# Altium schematic symbol library CUSTOM SCH - Copy.SchLib: 494 symbols (part 1 of 6) (continued)
## ADC3441
designator U?
footprint LFCSP-48(7x7) ADP5052
footprint QFN-56-EP(8x8) ADC3441
footprint ADC3441IRTQT
part A pins: 1 DA1P (out) "Positive serial LVDS output for wire-1 of channel A", 2 DA1M (out) "Negative serial LVDS output for wire-1 of channel A", 3 DA0P (out) "Positive serial LVDS output for wire-0 of channel A", 4 DA0M (out) "Negative serial LVDS output for wire-0 of channel A", 8 INAM (in) "Negative differential analog input for channel A", 9 INAP (in) "Positive differential analog input for channel A", 12 INBP (in) "Positive differential analog input for channel B", 13 INBM (in) "Negative differential analog input for channel B", 16 SCLK (in) "This pin has an internal 150-kΩ pullup resistor to AVDD", 17 SDATA (in) "Serial interface data input. This pin has an internal 150-kΩ pulldown resistor.", 18 ~{SEN} (in) "Serial interface enable; active low.", 19 SDOUT (out) "Serial interface data output", 21 CLKM (in) "Negative differential clock input for the ADC", 22 CLKP (in) "Positive differential clock input for the ADC", 24 RESET (in) "Hardware reset; active high. This pin has an internal 150-kΩ pulldown resistor.", 25 SYSREFP (in) "Positive external SYSREF input", 26 SYSREFM (in) "Negative external SYSREF input", 27 VCM (out) "Common-mode voltage for analog inputs", 30 INCM (in) "Negative differential analog input for channel C", 31 INCP (in) "Positive differential analog input for channel C", 34 INDP (in) "Positive differential analog input for channel D", 35 INDM (in) "Negative differential analog input for channel D", 39 DD1P (out) "Positive serial LVDS output for wire-1 of channel D", 40 DD1M (out) "Negative serial LVDS output for wire-1 of channel D", 41 DD0P (out) "Positive serial LVDS output for wire-0 of channel D", 42 DD0M (out) "Negative serial LVDS output for wire-0 of channel D", 43 DC1P (out) "Positive serial LVDS output for wire-1 of channel C", 44 DC1M (out) "Negative serial LVDS output for wire-1 of channel C", 45 DC0P (out) "Positive serial LVDS output for wire-0 of channel C", 46 DC0M (out) "Negative serial LVDS output for wire-0 of channel C", 48 FCLKP (out) "Positive frame clock output", 49 FCLKM (out) "Negative frame clock output", 50 DCLKP (out) "Positive bit clock output", 51 DCLKM (out) "Negative bit clock output", 53 DB1P (out) "Positive serial LVDS output for wire-1 of channel B", 54 DB1M (out) "Negative serial LVDS output for wire-1 of channel B", 55 DB0P (out) "Positive serial LVDS output for wire-0 of channel B", 56 DB0M (out) "Negative serial LVDS output for wire-0 of channel B", 57 GND (power) "Ground, 0 V. Connect to the printed circuit board (PCB) ground plane."
part B pins: 5 DVDD (power) "Digital 1.8-V power supply, decoupled with capacitors", 6 AVDD (power) "Analog 1.8-V power supply, decoupled with capacitors", 7 AVDD (power) "Analog 1.8-V power supply, decoupled with capacitors", 10 AVDD (power) "Analog 1.8-V power supply, decoupled with capacitors", 11 AVDD (power) "Analog 1.8-V power supply, decoupled with capacitors", 14 AVDD (power) "Analog 1.8-V power supply, decoupled with capacitors", 15 AVDD (power) "Analog 1.8-V power supply, decoupled with capacitors", 20 AVDD (power) "Analog 1.8-V power supply, decoupled with capacitors", 23 AVDD (power) "Analog 1.8-V power supply, decoupled with capacitors", 28 AVDD (power) "Analog 1.8-V power supply, decoupled with capacitors", 29 AVDD (power) "Analog 1.8-V power supply, decoupled with capacitors", 32 AVDD (power) "Analog 1.8-V power supply, decoupled with capacitors", 33 AVDD (power) "Analog 1.8-V power supply, decoupled with capacitors", 36 AVDD (power) "Analog 1.8-V power supply, decoupled with capacitors", 38 DVDD (power) "Digital 1.8-V power supply, decoupled with capacitors", 47 DVDD (power) "Digital 1.8-V power supply, decoupled with capacitors", 52 DVDD (power) "Digital 1.8-V power supply, decoupled with capacitors"

## ADP123AUJZ
designator U?
Manufacturer Part Number: ADP123AUJZ; Case/Package: *
pins: 1 VIN, 2 GND, 3 EN, 4 ADJ, 5 VOUT

## ADP2370ACPZ-5.0-R7
designator U?
Manufacturer Part Number: *; Case/Package: *
pins: 1 VIN, 2 FSEL, 3 EN, 4 SYNC, 5 FB, 6 PG, 7 SW, 8 PGND, 9 AGND

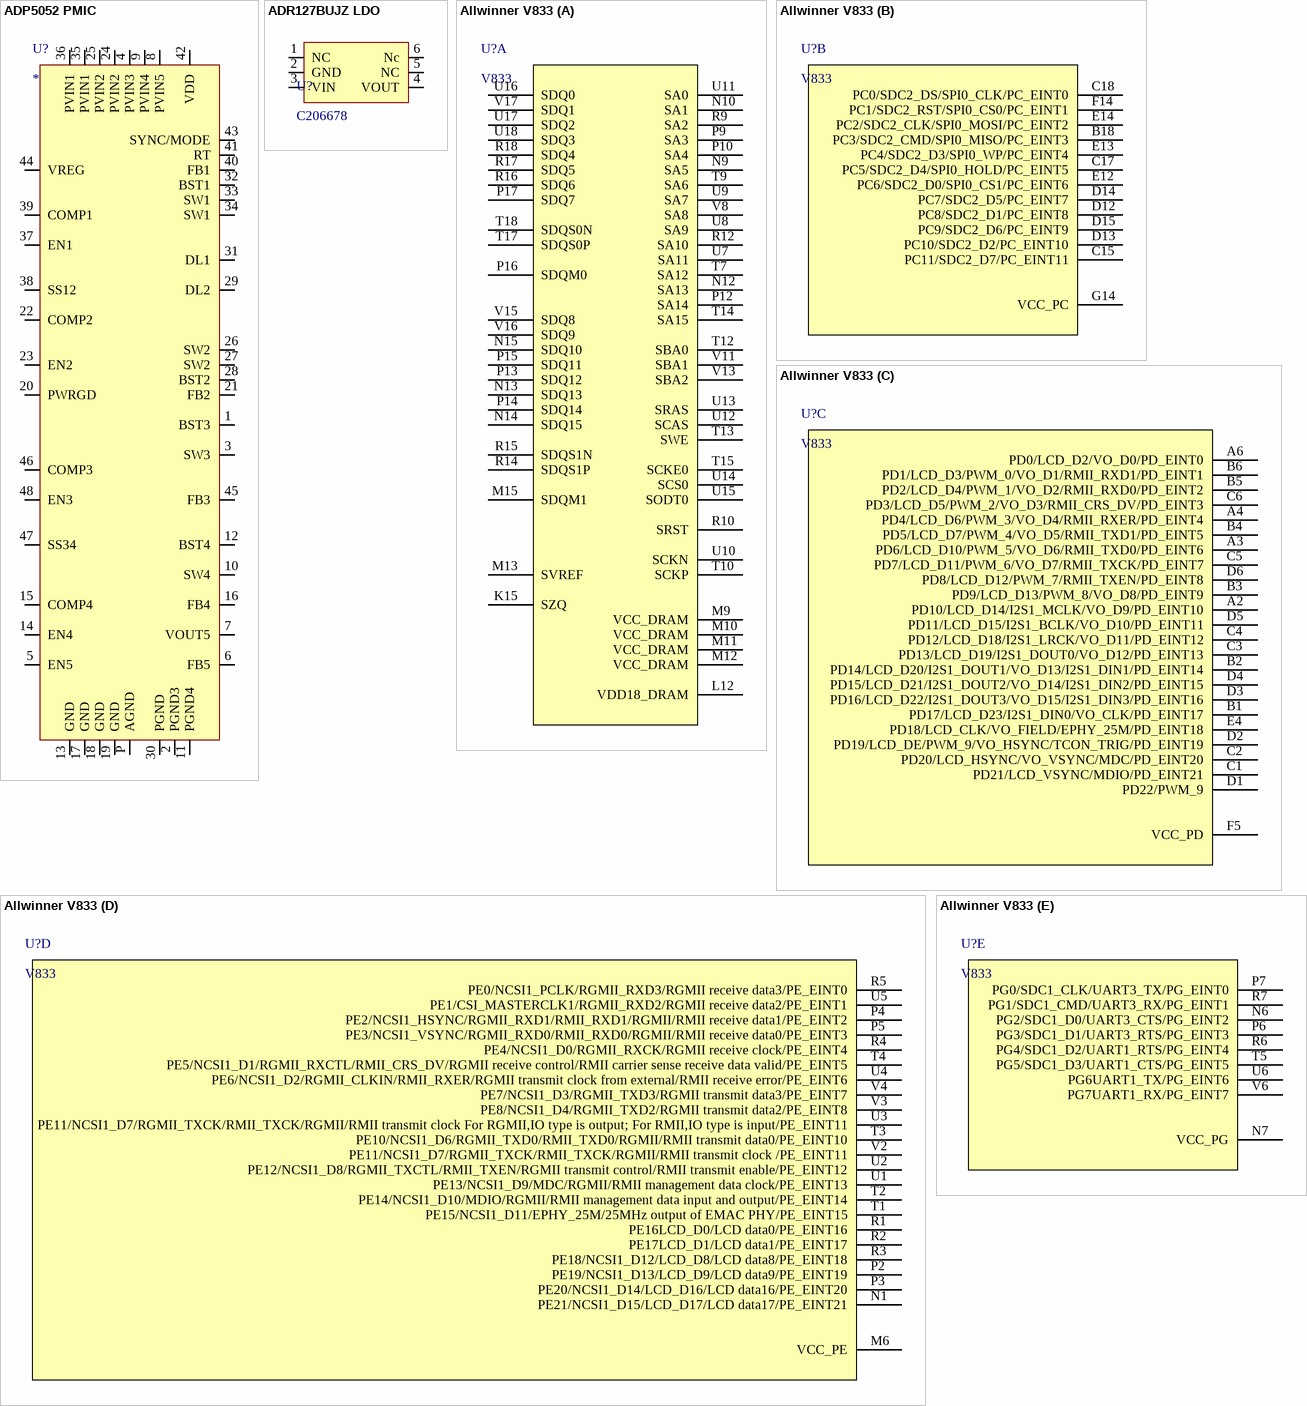
[diagram p3: symbols ADP5052 PMIC to Allwinner V833]

## ADP5052 PMIC
designator U?
Manufacturer Part Number: ADP5052; Case/Package: *
footprint LFCSP-48(7x7) ADP5052
pins: 1 BST3, 2 PGND3, 3 SW3, 4 PVIN3, 5 EN5, 6 FB5, 7 VOUT5, 8 PVIN5, 9 PVIN4, 10 SW4, 11 PGND4, 12 BST4, 13 GND, 14 EN4, 15 COMP4, 16 FB4, 17 GND, 18 GND, 19 GND, 20 PWRGD, 21 FB2, 22 COMP2, 23 EN2, 24 PVIN2, 25 PVIN2, 26 SW2, 27 SW2, 28 BST2, 29 DL2, 30 PGND, 31 DL1, 32 BST1, 33 SW1, 34 SW1, 35 PVIN1, 36 PVIN1, 37 EN1, 38 SS12, 39 COMP1, 40 FB1, 41 RT, 42 VDD, 43 SYNC/MODE, 44 VREG, 45 FB3, 46 COMP3, 47 SS34, 48 EN3, P AGND

## ADR127BUJZ LDO
designator U?, comment C206678
95uA 1.25V -40℃~+125℃@(Ta) ±0.12% 2.7V~18V series connection 9uVp-p 5mA 9ppm/℃ Fixed TSOT-23-6 Voltage References ROHS; Manufacturer Part NumberManufacturer Part Number: ADR127BUJZ; Case/Package: *
footprint TSOT-23-6
pins: 1 NC, 2 GND, 3 VIN, 4 VOUT, 5 NC, 6 Nc

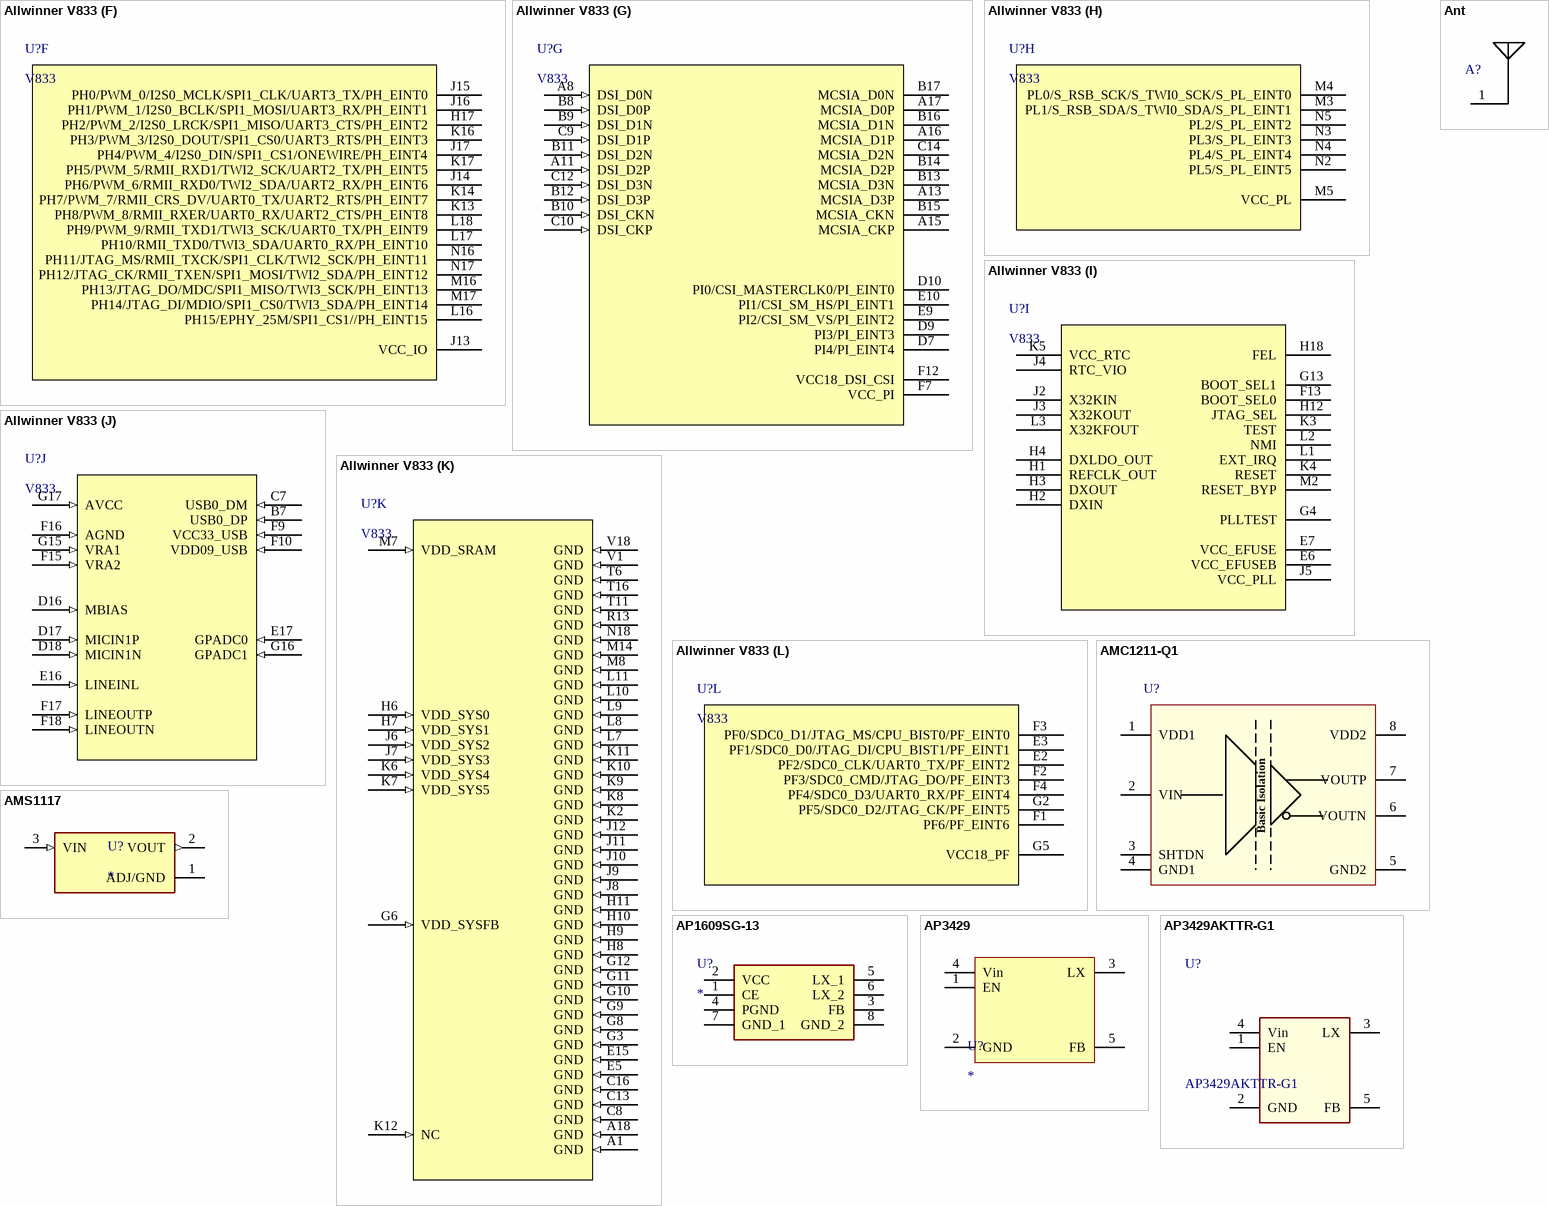
[diagram p4: symbols Allwinner V833 to AP3429AKTTR-G1]

## Allwinner V833
designator U?, comment V833
Manufacturer Part Number: Allwinner V833; Case/Package: LFBGA273
footprint LFBGA273 (Allwinner V833)
part A pins: K15 SZQ, L12 VDD18_DRAM, M9 VCC_DRAM, M10 VCC_DRAM, M11 VCC_DRAM, M12 VCC_DRAM, M13 SVREF, M15 SDQM1, N9 SA5, N10 SA1, N12 SA13, N13 SDQ13, N14 SDQ15, N15 SDQ10, P9 SA3, P10 SA4, P12 SA14, P13 SDQ12, P14 SDQ14, P15 SDQ11, P16 SDQM0, P17 SDQ7, R9 SA2, R10 SRST, R12 SA10, R14 SDQS1P, R15 SDQS1N, R16 SDQ6, R17 SDQ5, R18 SDQ4, T7 SA12, T9 SA6, T10 SCKP, T12 SBA0, T13 SWE, T14 SA15, T15 SCKE0, T17 SDQS0P, T18 SDQS0N, U7 SA11, U8 SA9, U9 SA7, U10 SCKN, U11 SA0, U12 SCAS, U13 SRAS, U14 SCS0, U15 SODT0, U16 SDQ0, U17 SDQ2, U18 SDQ3, V8 SA8, V11 SBA1, V13 SBA2, V15 SDQ8, V16 SDQ9, V17 SDQ1
part B pins: B18 PC3/SDC2_CMD/SPI0_MISO/PC_EINT3, C15 PC11/SDC2_D7/PC_EINT11, C17 PC5/SDC2_D4/SPI0_HOLD/PC_EINT5, C18 PC0/SDC2_DS/SPI0_CLK/PC_EINT0, D12 PC8/SDC2_D1/PC_EINT8, D13 PC10/SDC2_D2/PC_EINT10, D14 PC7/SDC2_D5/PC_EINT7, D15 PC9/SDC2_D6/PC_EINT9, E12 PC6/SDC2_D0/SPI0_CS1/PC_EINT6, E13 PC4/SDC2_D3/SPI0_WP/PC_EINT4, E14 PC2/SDC2_CLK/SPI0_MOSI/PC_EINT2, F14 PC1/SDC2_RST/SPI0_CS0/PC_EINT1, G14 VCC_PC
part C pins: A2 PD10/LCD_D14/I2S1_MCLK/VO_D9/PD_EINT10, A3 PD6/LCD_D10/PWM_5/VO_D6/RMII_TXD0/PD_EINT6, A4 PD4/LCD_D6/PWM_3/VO_D4/RMII_RXER/PD_EINT4, A6 PD0/LCD_D2/VO_D0/PD_EINT0, B1 PD17/LCD_D23/I2S1_DIN0/VO_CLK/PD_EINT17, B2 PD14/LCD_D20/I2S1_DOUT1/VO_D13/I2S1_DIN1/PD_EINT14, B3 PD9/LCD_D13/PWM_8/VO_D8/PD_EINT9, B4 PD5/LCD_D7/PWM_4/VO_D5/RMII_TXD1/PD_EINT5, B5 PD2/LCD_D4/PWM_1/VO_D2/RMII_RXD0/PD_EINT2, B6 PD1/LCD_D3/PWM_0/VO_D1/RMII_RXD1/PD_EINT1, C1 PD21/LCD_VSYNC/MDIO/PD_EINT21, C2 PD20/LCD_HSYNC/VO_VSYNC/MDC/PD_EINT20, C3 PD13/LCD_D19/I2S1_DOUT0/VO_D12/PD_EINT13, C4 PD12/LCD_D18/I2S1_LRCK/VO_D11/PD_EINT12, C5 PD7/LCD_D11/PWM_6/VO_D7/RMII_TXCK/PD_EINT7, C6 PD3/LCD_D5/PWM_2/VO_D3/RMII_CRS_DV/PD_EINT3, D1 PD22/PWM_9, D2 PD19/LCD_DE/PWM_9/VO_HSYNC/TCON_TRIG/PD_EINT19, D3 PD16/LCD_D22/I2S1_DOUT3/VO_D15/I2S1_DIN3/PD_EINT16, D4 PD15/LCD_D21/I2S1_DOUT2/VO_D14/I2S1_DIN2/PD_EINT15, D5 PD11/LCD_D15/I2S1_BCLK/VO_D10/PD_EINT11, D6 PD8/LCD_D12/PWM_7/RMII_TXEN/PD_EINT8, E4 PD18/LCD_CLK/VO_FIELD/EPHY_25M/PD_EINT18, F5 VCC_PD
part D pins: M6 VCC_PE, N1 PE21/NCSI1_D15/LCD_D17/LCD data17/PE_EINT21, P2 PE19/NCSI1_D13/LCD_D9/LCD data9/PE_EINT19, P3 PE20/NCSI1_D14/LCD_D16/LCD data16/PE_EINT20, P4 PE2/NCSI1_HSYNC/RGMII_RXD1/RMII_RXD1/RGMII/RMII receive data1/PE_EINT2, P5 PE3/NCSI1_VSYNC/RGMII_RXD0/RMII_RXD0/RGMII/RMII receive data0/PE_EINT3, R1 PE16LCD_D0/LCD data0/PE_EINT16, R2 PE17LCD_D1/LCD data1/PE_EINT17, R3 PE18/NCSI1_D12/LCD_D8/LCD data8/PE_EINT18, R4 PE4/NCSI1_D0/RGMII_RXCK/RGMII receive clock/PE_EINT4, R5 PE0/NCSI1_PCLK/RGMII_RXD3/RGMII receive data3/PE_EINT0, T1 PE15/NCSI1_D11/EPHY_25M/25MHz output of EMAC PHY/PE_EINT15, T2 PE14/NCSI1_D10/MDIO/RGMII/RMII management data input and output/PE_EINT14, T3 PE10/NCSI1_D6/RGMII_TXD0/RMII_TXD0/RGMII/RMII transmit data0/PE_EINT10, T4 PE5/NCSI1_D1/RGMII_RXCTL/RMII_CRS_DV/RGMII receive control/RMII carrier sense receive data valid/PE_EINT5, U1 PE13/NCSI1_D9/MDC/RGMII/RMII management data clock/PE_EINT13, U2 PE12/NCSI1_D8/RGMII_TXCTL/RMII_TXEN/RGMII transmit control/RMII transmit enable/PE_EINT12, U3 PE11/NCSI1_D7/RGMII_TXCK/RMII_TXCK/RGMII/RMII transmit clock For RGMII,IO type is output; For RMII,IO type is input/PE_EINT11, U4 PE6/NCSI1_D2/RGMII_CLKIN/RMII_RXER/RGMII transmit clock from external/RMII receive error/PE_EINT6, U5 PE1/CSI_MASTERCLK1/RGMII_RXD2/RGMII receive data2/PE_EINT1, V2 PE11/NCSI1_D7/RGMII_TXCK/RMII_TXCK/RGMII/RMII transmit clock /PE_EINT11, V3 PE8/NCSI1_D4/RGMII_TXD2/RGMII transmit data2/PE_EINT8, V4 PE7/NCSI1_D3/RGMII_TXD3/RGMII transmit data3/PE_EINT7
part E pins: N6 PG2/SDC1_D0/UART3_CTS/PG_EINT2, N7 VCC_PG, P6 PG3/SDC1_D1/UART3_RTS/PG_EINT3, P7 PG0/SDC1_CLK/UART3_TX/PG_EINT0, R6 PG4/SDC1_D2/UART1_RTS/PG_EINT4, R7 PG1/SDC1_CMD/UART3_RX/PG_EINT1, T5 PG5/SDC1_D3/UART1_CTS/PG_EINT5, U6 PG6UART1_TX/PG_EINT6, V6 PG7UART1_RX/PG_EINT7
part F pins: H17 PH2/PWM_2/I2S0_LRCK/SPI1_MISO/UART3_CTS/PH_EINT2, J13 VCC_IO, J14 PH6/PWM_6/RMII_RXD0/TWI2_SDA/UART2_RX/PH_EINT6, J15 PH0/PWM_0/I2S0_MCLK/SPI1_CLK/UART3_TX/PH_EINT0, J16 PH1/PWM_1/I2S0_BCLK/SPI1_MOSI/UART3_RX/PH_EINT1, J17 PH4/PWM_4/I2S0_DIN/SPI1_CS1/ONEWIRE/PH_EINT4, K13 PH8/PWM_8/RMII_RXER/UART0_RX/UART2_CTS/PH_EINT8, K14 PH7/PWM_7/RMII_CRS_DV/UART0_TX/UART2_RTS/PH_EINT7, K16 PH3/PWM_3/I2S0_DOUT/SPI1_CS0/UART3_RTS/PH_EINT3, K17 PH5/PWM_5/RMII_RXD1/TWI2_SCK/UART2_TX/PH_EINT5, L16 PH15/EPHY_25M/SPI1_CS1//PH_EINT15, L17 PH10/RMII_TXD0/TWI3_SDA/UART0_RX/PH_EINT10, L18 PH9/PWM_9/RMII_TXD1/TWI3_SCK/UART0_TX/PH_EINT9, M16 PH13/JTAG_DO/MDC/SPI1_MISO/TWI3_SCK/PH_EINT13, M17 PH14/JTAG_DI/MDIO/SPI1_CS0/TWI3_SDA/PH_EINT14, N16 PH11/JTAG_MS/RMII_TXCK/SPI1_CLK/TWI2_SCK/PH_EINT11, N17 PH12/JTAG_CK/RMII_TXEN/SPI1_MOSI/TWI2_SDA/PH_EINT12
part G pins: A8 DSI_D0N (in), A11 DSI_D2P (in), A13 MCSIA_D3P, A15 MCSIA_CKP, A16 MCSIA_D1P, A17 MCSIA_D0P, B8 DSI_D0P (in), B9 DSI_D1N (in), B10 DSI_CKN (in), B11 DSI_D2N (in), B12 DSI_D3P (in), B13 MCSIA_D3N, B14 MCSIA_D2P, B15 MCSIA_CKN, B16 MCSIA_D1N, B17 MCSIA_D0N, C9 DSI_D1P (in), C10 DSI_CKP (in), C12 DSI_D3N (in), C14 MCSIA_D2N, D7 PI4/PI_EINT4, D9 PI3/PI_EINT3, D10 PI0/CSI_MASTERCLK0/PI_EINT0, E9 PI2/CSI_SM_VS/PI_EINT2, E10 PI1/CSI_SM_HS/PI_EINT1, F7 VCC_PI, F12 VCC18_DSI_CSI
part H pins: M3 PL1/S_RSB_SDA/S_TWI0_SDA/S_PL_EINT1, M4 PL0/S_RSB_SCK/S_TWI0_SCK/S_PL_EINT0, M5 VCC_PL, N2 PL5/S_PL_EINT5, N3 PL3/S_PL_EINT3, N4 PL4/S_PL_EINT4, N5 PL2/S_PL_EINT2
part I pins: E6 VCC_EFUSEB (hiz), E7 VCC_EFUSE (hiz), F13 BOOT_SEL0 (hiz), G4 PLLTEST (hiz), G13 BOOT_SEL1 (hiz), H1 REFCLK_OUT (hiz), H2 DXIN (hiz), H3 DXOUT (hiz), H4 DXLDO_OUT (hiz), H12 JTAG_SEL (hiz), H18 FEL (hiz), J2 X32KIN (hiz), J3 X32KOUT (hiz), J4 RTC_VIO (hiz), J5 VCC_PLL (hiz), K3 TEST (hiz), K4 RESET (hiz), K5 VCC_RTC (hiz), L1 EXT_IRQ (hiz), L2 NMI (hiz), L3 X32KFOUT (hiz), M2 RESET_BYP (hiz)
part J pins: B7 USB0_DP (in), C7 USB0_DM (in), D16 MBIAS (in), D17 MICIN1P (in), D18 MICIN1N (in), E16 LINEINL (in), E17 GPADC0 (in), F9 VCC33_USB (in), F10 VDD09_USB (in), F15 VRA2 (in), F16 AGND (in), F17 LINEOUTP (in), F18 LINEOUTN (in), G15 VRA1 (in), G16 GPADC1 (in), G17 AVCC (in)
part K pins: A1 GND (in), A18 GND (in), C8 GND (in), C13 GND (in), C16 GND (in), E5 GND (in), E15 GND (in), G3 GND (in), G6 VDD_SYSFB (in), G8 GND (in), G9 GND (in), G10 GND (in), G11 GND (in), G12 GND (in), H6 VDD_SYS0 (in), H7 VDD_SYS1 (in), H8 GND (in), H9 GND (in), H10 GND (in), H11 GND (in), J6 VDD_SYS2 (in), J7 VDD_SYS3 (in), J8 GND (in), J9 GND (in), J10 GND (in), J11 GND (in), J12 GND (in), K2 GND (in), K6 VDD_SYS4 (in), K7 VDD_SYS5 (in), K8 GND (in), K9 GND (in), K10 GND (in), K11 GND (in), K12 NC (in), L7 GND (in), L8 GND (in), L9 GND (in), L10 GND (in), L11 GND (in), M7 VDD_SRAM (in), M8 GND (in), M14 GND (in), N18 GND (in), R13 GND (in), T6 GND (in), T11 GND (in), T16 GND (in), V1 GND (in), V18 GND (in)
part L pins: E2 PF2/SDC0_CLK/UART0_TX/PF_EINT2, E3 PF1/SDC0_D0/JTAG_DI/CPU_BIST1/PF_EINT1, F1 PF6/PF_EINT6, F2 PF3/SDC0_CMD/JTAG_DO/PF_EINT3, F3 PF0/SDC0_D1/JTAG_MS/CPU_BIST0/PF_EINT0, F4 PF4/SDC0_D3/UART0_RX/PF_EINT4, G2 PF5/SDC0_D2/JTAG_CK/PF_EINT5, G5 VCC18_PF

## AMC1211-Q1
designator U?
Manufacturer: Texas Instruments; Manufacturer Part Number: AMC1211AQDWVRQ1; Number of Circuits: 1; Gain Bandwidth Product: 275kHz; Input Bias Current: 3.5nA; Input Offset Voltage (Vos): 1.1mV; Operating Supply Current: 7.1mA; Output Current per Channel: 13mA; Supplier 1: Digi-Key; RoHS: No; Category: Amplifiers - Op Amps, Buffer, Instrumentation; Stock 1: 22; Pricing 1: 1=6.25000, 10=5.64800, 25=5.38520 (USD); Mount: Surface Mount; Case/Package: SOIC; Number of Pins: 8; Min Operating Temperature: -40°C; Max Operating Temperature: 125°C; Packaging: Tape and Reel; ComponentLink1URL: http://www.ti.com/general/docs/suppproductinfo.tsp?distId=10&amp;gotoUrl=http%3A%2F%2Fwww.ti.com%2Flit%2Fgpn%2Famc1211-q1&src-supplier=Digi-Key; ComponentLink1Description: http://www.ti.com/general/docs/suppproductinfo.tsp?distId=10&amp;gotoUrl=http%3A%2F%2Fwww.ti.com%2Flit%2Fgpn%2Famc1211-q1&src-supplier=Digi-Key; ComponentLink2URL: http://www.ti.com/lit/an/sbaa289/sbaa289.pdf?src-supplier=Digi-Key; ComponentLink2Description: http://www.ti.com/lit/an/sbaa289/sbaa289.pdf?src-supplier=Digi-Key; ComponentLink3URL: http://www.ti.com/lit/ds/symlink/amc1211-q1.pdf?src-supplier=Digi-Key; ComponentLink3Description: http://www.ti.com/lit/ds/symlink/amc1211-q1.pdf?src-supplier=Digi-Key; Supplier Part Number 1: 296-AMC1211AQDWVRQ1CT-ND
pins: 1 VDD1, 2 VIN, 3 SHTDN, 4 GND1, 5 GND2, 6 VOUTN, 7 VOUTP, 8 VDD2
text: Basic Isolation

## AMS1117
designator U?
SOT-223/Pkg 1-Amp 3.3-Volt Low Drop Out Voltage Regulatator; Manufacturer Part Number: AMS1117-3.3; Case/Package: SOT-223; ComponentLink1Description: Link; ComponentLink1URL: https://www.lcsc.com/product-detail/Linear-Voltage-Regulators-LDO_Advanced-Monolithic-Systems-AMS1117_C6188.html
footprint AMS1117 (SOT223)
pins: 1 ADJ/GND (power), 2 VOUT (out), 3 VIN (in)

## Ant
designator A?  (value not drawn)
footprint ant
pins: 1 Ant

## AP1609SG-13
designator U?
Boost Conv DCDC  2.5V to 6V 8Pin SOP DiodesZetex AP1609SG-13; Manufacturer_Name: Diodes Inc.; Datasheet Link: https://www.diodes.com/assets/Datasheets/AP1609.pdf; Package: SMD; Manufacturer Part Number: AP1609SG-13; Mouser Part Number: 621-AP1609SG-13
footprint SOIC127P600X175-8N
pins: 1 CE, 2 VCC, 3 FB, 4 PGND, 5 LX_1, 6 LX_2, 7 GND_1, 8 GND_2

## AP3429
designator U?
Manufacturer Part Number: *; Package: *; Parameter 3: *
pins: 1 EN (power), 2 GND, 3 LX, 4 Vin (power), 5 FB (power)

## AP3429AKTTR-G1
designator U?
IC REG BUCK ADJ 2A SYNC TSOT25; Manufacturer Part Number: AP3429AKTTR-G1; Case/Package: SOT-23-5; Output Current: 2A; ComponentLink1URL: https://www.diodes.com/assets/Datasheets/AP3429.pdf?src-supplier=Digi-Key; ComponentLink1Description: https://www.diodes.com/assets/Datasheets/AP3429.pdf?src-supplier=Digi-Key
footprint SOT25
pins: 1 EN (power), 2 GND, 3 LX, 4 Vin (power), 5 FB (power)

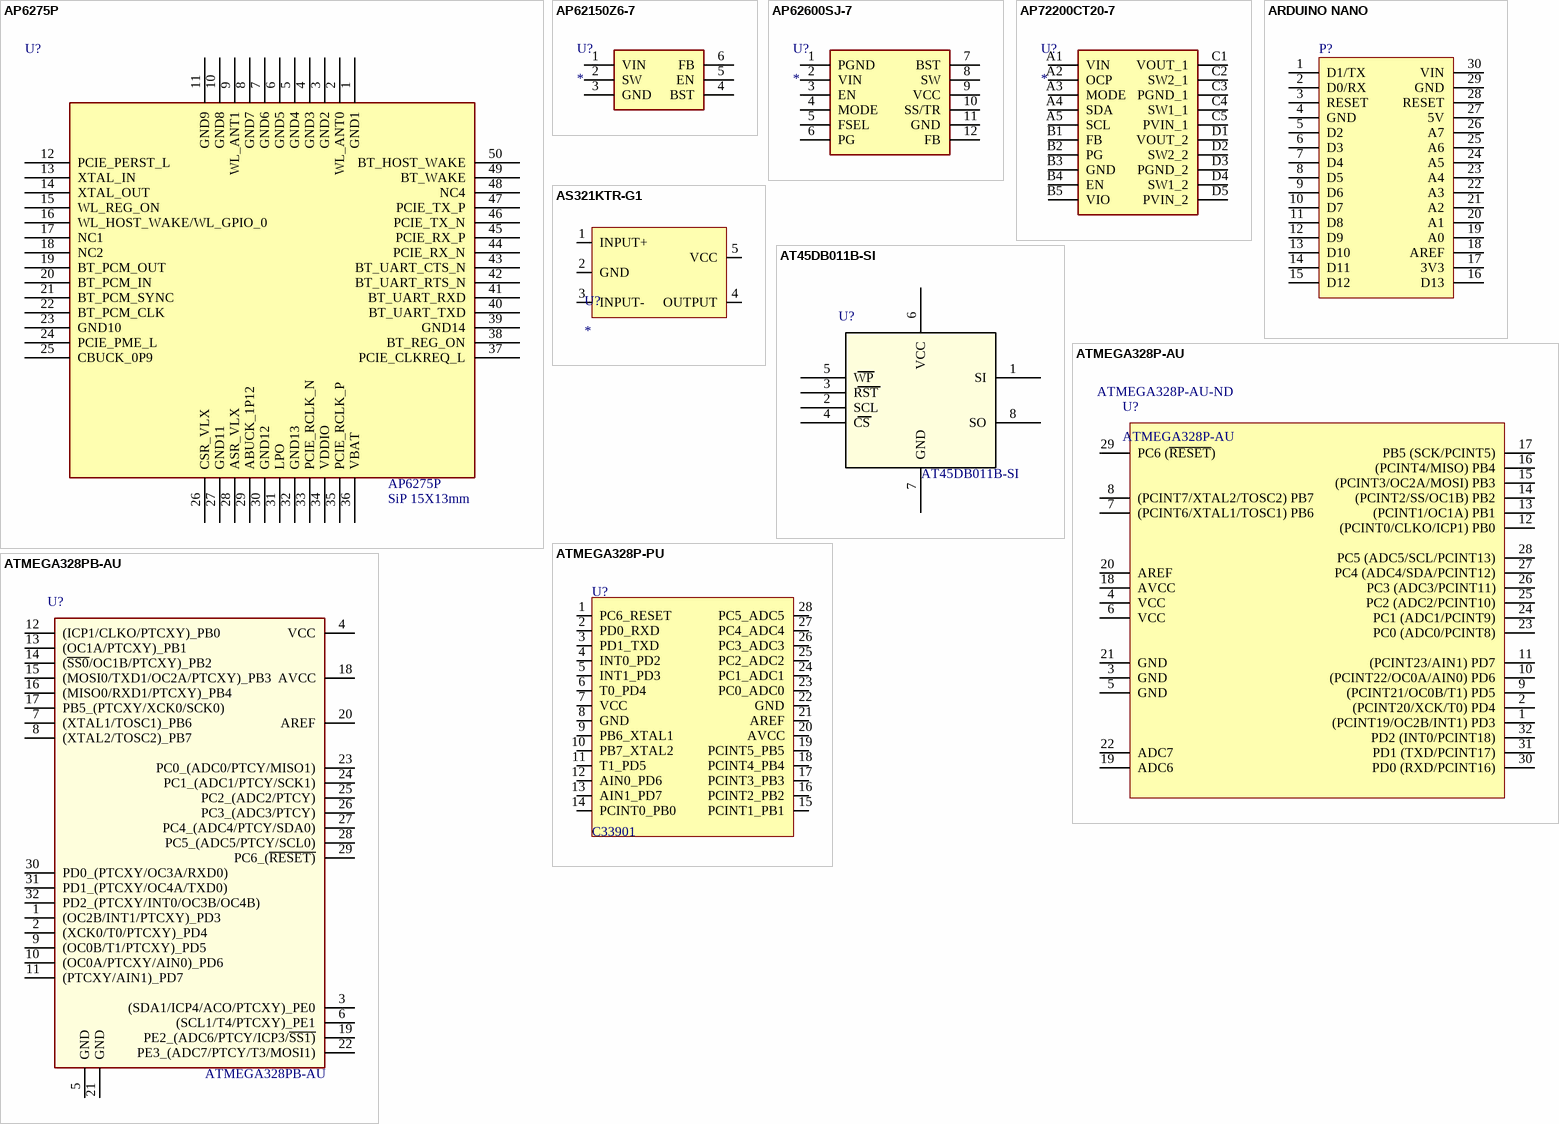
[diagram p5: symbols AP6275P to ATMEGA328PB-AU]

## AP6275P
designator U?  Manufacturer Part Number: AP6275P  Case/Package: SiP 15X13mm
WiFi 802.11b/g/n + BT5.0
footprint MD50_WIFI-AP6275P
pins: 1 GND1, 2 WL_ANT0, 3 GND2, 4 GND3, 5 GND4, 6 GND5, 7 GND6, 8 GND7, 9 WL_ANT1, 10 GND8, 11 GND9, 12 PCIE_PERST_L, 13 XTAL_IN, 14 XTAL_OUT, 15 WL_REG_ON, 16 WL_HOST_WAKE/WL_GPIO_0, 17 NC1, 18 NC2, 19 BT_PCM_OUT, 20 BT_PCM_IN, 21 BT_PCM_SYNC, 22 BT_PCM_CLK, 23 GND10, 24 PCIE_PME_L, 25 CBUCK_0P9, 26 CSR_VLX, 27 GND11, 28 ASR_VLX, 29 ABUCK_1P12, 30 GND12, 31 LPO, 32 GND13, 33 PCIE_RCLK_N, 34 VDDIO, 35 PCIE_RCLK_P, 36 VBAT, 37 PCIE_CLKREQ_L, 38 BT_REG_ON, 39 GND14, 40 BT_UART_TXD, 41 BT_UART_RXD, 42 BT_UART_RTS_N, 43 BT_UART_CTS_N, 44 PCIE_RX_N, 45 PCIE_RX_P, 46 PCIE_TX_N, 47 PCIE_TX_P, 48 NC4, 49 BT_WAKE, 50 BT_HOST_WAKE

## AP62150Z6-7
designator U?
Switching Voltage Regulators DCDC Conv HV Buck SOT563 T&R 3K; Manufacturer Part Number: AP62150Z6-7; Case/Package: SOT-563
footprint AP62150Z67
pins: 1 VIN, 2 SW, 3 GND, 4 BST, 5 EN, 6 FB

## AP62600SJ-7
designator U?
Switching Voltage Regulators DCDC Conv HV Buck V-QFN2030-12 T&R 3K; Manufacturer_Part_Number: AP62600SJ-7; Case/Package: V-QFN2030-12
footprint AP62600SJ7
pins: 1 PGND, 2 VIN, 3 EN, 4 MODE, 5 FSEL, 6 PG, 7 BST, 8 SW, 9 VCC, 10 SS/TR, 11 GND, 12 FB

## AP72200CT20-7
designator U?
Switching Voltage Regulators DCDC Conv LV Buck/ Boost; Manufacturer_Part_Number: AP72200CT20-7; Case/Package: BGA 20; Value: *
footprint BGA20C40P5X4_212X175X69
pins: A1 VIN, A2 OCP, A3 MODE, A4 SDA, A5 SCL, B1 FB, B2 PG, B3 GND, B4 EN, B5 VIO, C1 VOUT_1, C2 SW2_1, C3 PGND_1, C4 SW1_1, C5 PVIN_1, D1 VOUT_2, D2 SW2_2, D3 PGND_2, D4 SW1_2, D5 PVIN_2

## ARDUINO NANO
designator P?
Header, 15-Pin, Dual row; Manufacturer: Seeed Studio; Manufacturer Part Number: 102010019; Evaluation Kit: Yes; Core Architecture: AVR; Supplier 1: Digi-Key; Stock 1: 0; Supplier Part Number 1: 102010019-ND
signal-integrity model Connector
footprint ARDUINO NANO (Connector; Header; 15x2 Position)
pins: 1 D1/TX, 2 D0/RX, 3 RESET, 4 GND, 5 D2, 6 D3, 7 D4, 8 D5, 9 D6, 10 D7, 11 D8, 12 D9, 13 D10, 14 D11, 15 D12, 16 D13, 17 3V3, 18 AREF, 19 A0, 20 A1, 21 A2, 22 A3, 23 A4, 24 A5, 25 A6, 26 A7, 27 5V, 28 RESET, 29 GND, 30 VIN

## AS321KTR-G1
designator U?
General Purpose Amplifier 1 Circuit SOT-25; Manufacturer Part Number: AS321KTR-G1; Case/Package: SOT-25; Parameter 3: *
footprint SOT23-5
pins: 1 INPUT+, 2 GND, 3 INPUT-, 4 OUTPUT, 5 VCC

## AT45DB011B-SI
designator U?  Manufacturer Part Number: AT45DB011B-SI
IC FLASH 1M SPI 20MHZ 8SOIC; Manufacturer: Microchip / Atmel; Interface: SPI,Serial; Max Supply Voltage: 3.6V; Min Supply Voltage: 2.7V; Access Time: 7ns; Memory Type: NOR,FLASH,DataFLASH; Memory Size: 264B; Data Bus Width: 8b; Supplier 1: Digi-Key; Stock 1: 0; Case/Package: 8-SOIC; Number of Pins: 8; Min Operating Temperature: -40°C; Max Operating Temperature: 85°C; Package Quantity: 95; Packaging: Rail/Tube; Frequency: 20MHz; Max Frequency: 20MHz; Lead Free: Contains Lead; Supplier Part Number 1: AT45DB011B-SI-ND
footprint 8-soic
pins: 1 SI, 2 SCL, 3 RST, 4 CS, 5 WP, 6 VCC (power), 7 GND (power), 8 SO

## ATMEGA328P-AU
designator U?  Supplier Part Number 1: ATMEGA328P-AU-ND
MICROCHIP - ATMEGA328P-AU. - MICROCONTROLLER MCU, 8 BIT, ATMEGA, 20MHZ, TQFP-32; Manufacturer 1: Microchip / Atmel; Interface: I2C,SPI,UART,USART,2-Wire; RAM Size: 2KB; Max Supply Voltage: 5.5V; Min Supply Voltage: 1.8V; Number of I/Os: 23; Number of Timers/Counters: 3; Oscillator Type: Internal; Data Bus Width: 8b; Watchdog Timer: Yes; Memory Type: FLASH; Memory Size: 32KB; Peripherals: Brown-out Detect/Reset,POR,PWM,WDT; Core Architecture: AVR; Number of ADC Channels: 8; Number of PWM Channels: 6; Number of SPI Channels: 1; Supplier 1: Digi-Key; Manufacturer Part Number: ATMEGA328P-AU; RoHS: Yes; Category: Microcontrollers; Stock 1: 4578; Pricing 1: 1=2.01000, 25=1.84000, 100=1.67000 (USD); Mount: Surface Mount; Case/Package: TQFP-32; Number of Pins: 32; Min Operating Temperature: -40°C; Max Operating Temperature: 85°C; Packaging: Tray; Package Quantity: 250; Frequency: 20MHz; Number of Programmable I/O: 23; Max Frequency: 20MHz; Number of I2C Channels: 1; Length: 7mm; Height: 1.05mm; Width: 7mm; Radiation Hardening: No; REACH SVHC: No SVHC; Lead Free: Lead Free; ComponentLink1URL: https://datasheet.ciiva.com/1166/doc8161-1166860.pdf?src-supplier=Newark; ComponentLink1Description: https://datasheet.ciiva.com/1166/doc8161-1166860.pdf?src-supplier=Newark; ComponentLink2URL: https://datasheet.ciiva.com/29119/155196-da-01-en-microcontr-atmega328p-au-8bit-tqfp-32-29119594.pdf?src-supplier=Conrad; ComponentLink2Description: https://datasheet.ciiva.com/29119/155196-da-01-en-microcontr-atmega328p-au-8bit-tqfp-32-29119594.pdf?src-supplier=Conrad; ComponentLink3URL: https://datasheet.ciiva.com/15213/getdatasheetpartid-365828-15213131.pdf?src-supplier=Verical; ComponentLink3Description: https://datasheet.ciiva.com/15213/getdatasheetpartid-365828-15213131.pdf?src-supplier=Verical; ComponentLink4URL: https://datasheet.ciiva.com/1157/1693866-1157693.pdf?src-supplier=Element14; ComponentLink4Description: https://datasheet.ciiva.com/1157/1693866-1157693.pdf?src-supplier=Element14
footprint TQFP-32_7x7x08P
pins: 1 (PCINT19/OC2B/INT1) PD3, 2 (PCINT20/XCK/T0) PD4, 3 GND, 4 VCC, 5 GND, 6 VCC, 7 (PCINT6/XTAL1/TOSC1) PB6, 8 (PCINT7/XTAL2/TOSC2) PB7, 9 (PCINT21/OC0B/T1) PD5, 10 (PCINT22/OC0A/AIN0) PD6, 11 (PCINT23/AIN1) PD7, 12 (PCINT0/CLKO/ICP1) PB0, 13 (PCINT1/OC1A) PB1, 14 (PCINT2/SS/OC1B) PB2, 15 (PCINT3/OC2A/MOSI) PB3, 16 (PCINT4/MISO) PB4, 17 PB5 (SCK/PCINT5), 18 AVCC, 19 ADC6, 20 AREF, 21 GND, 22 ADC7, 23 PC0 (ADC0/PCINT8), 24 PC1 (ADC1/PCINT9), 25 PC2 (ADC2/PCINT10), 26 PC3 (ADC3/PCINT11), 27 PC4 (ADC4/SDA/PCINT12), 28 PC5 (ADC5/SCL/PCINT13), 29 PC6 (~{RESET}), 30 PD0 (RXD/PCINT16), 31 PD1 (TXD/PCINT17), 32 PD2 (INT0/PCINT18)

## ATMEGA328P-PU
designator U?, comment C33901
2KB 16K@x16bit -40℃~+85℃ 1.8V~5.5V AVR 1@x6ch/10bit Internal oscillator included 20MHz 23 1KB DIP-28_300mil Microcontroller Units (MCUs/MPUs/SOCs) ROHS; Manufacturer Part Number: ATMEGA328P-PU; Case/Package: DIP-28_300mil; ComponentLink1Description: New link; ComponentLink1URL: https://www.lcsc.com/product-detail/Microcontroller-Units-MCUs-MPUs-SOCs_Microchip-Tech-ATMEGA328P-PU_C33901.html
footprint ATMEGA328P-PU_  DIP-28_300mil
pins: 1 PC6_RESET, 2 PD0_RXD, 3 PD1_TXD, 4 INT0_PD2, 5 INT1_PD3, 6 T0_PD4, 7 VCC, 8 GND, 9 PB6_XTAL1, 10 PB7_XTAL2, 11 T1_PD5, 12 AIN0_PD6, 13 AIN1_PD7, 14 PCINT0_PB0, 15 PCINT1_PB1, 16 PCINT2_PB2, 17 PCINT3_PB3, 18 PCINT4_PB4, 19 PCINT5_PB5, 20 AVCC, 21 AREF, 22 GND, 23 PC0_ADC0, 24 PC1_ADC1, 25 PC2_ADC2, 26 PC3_ADC3, 27 PC4_ADC4, 28 PC5_ADC5

## ATMEGA328PB-AU
designator U?  Manufacturer Part Number: ATMEGA328PB-AU  (hidden comment: *)
IC MCU 8BIT 32KB FLASH 32TQFP; Manufacturer 1: Microchip; Supplier 1: Digi-Key; RoHS: No; Category: Microcontrollers; Stock 1: 5484; Pricing 1: 1=1.34000, 25=1.23000, 100=1.12000 (USD); Case/Package: TQFP-32_7x7x08P; ComponentLink1URL: http://www.farnell.com/datasheets/2915218.pdf?src-supplier=Farnell; ComponentLink1Description: http://www.farnell.com/datasheets/2915218.pdf?src-supplier=Farnell; ComponentLink2URL: http://www.farnell.com/datasheets/2915218.pdf?src-supplier=Newark; ComponentLink2Description: http://www.farnell.com/datasheets/2915218.pdf?src-supplier=Newark; ComponentLink3URL: http://www.microchip.com/mymicrochip/filehandler.aspx?ddocname=en589666&src-supplier=Digi-Key; ComponentLink3Description: http://www.microchip.com/mymicrochip/filehandler.aspx?ddocname=en589666&src-supplier=Digi-Key; Supplier Part Number 1: ATMEGA328PB-AU-ND
footprint TQFP-32
pins: 1 (OC2B/INT1/PTCXY)_PD3, 2 (XCK0/T0/PTCXY)_PD4, 3 (SDA1/ICP4/ACO/PTCXY)_PE0, 4 VCC, 5 GND, 6 (SCL1/T4/PTCXY)_PE1, 7 (XTAL1/TOSC1)_PB6, 8 (XTAL2/TOSC2)_PB7, 9 (OC0B/T1/PTCXY)_PD5, 10 (OC0A/PTCXY/AIN0)_PD6, 11 (PTCXY/AIN1)_PD7, 12 (ICP1/CLKO/PTCXY)_PB0, 13 (OC1A/PTCXY)_PB1, 14 (~{SS0}/OC1B/PTCXY)_PB2, 15 (MOSI0/TXD1/OC2A/PTCXY)_PB3, 16 (MISO0/RXD1/PTCXY)_PB4, 17 PB5_(PTCXY/XCK0/SCK0), 18 AVCC, 19 PE2_(ADC6/PTCY/ICP3/~{SS1)}, 20 AREF, 21 GND, 22 PE3_(ADC7/PTCY/T3/MOSI1), 23 PC0_(ADC0/PTCY/MISO1), 24 PC1_(ADC1/PTCY/SCK1), 25 PC2_(ADC2/PTCY), 26 PC3_(ADC3/PTCY), 27 PC4_(ADC4/PTCY/SDA0), 28 PC5_(ADC5/PTCY/SCL0), 29 PC6_(~{RESET)}, 30 PD0_(PTCXY/OC3A/RXD0), 31 PD1_(PTCXY/OC4A/TXD0), 32 PD2_(PTCXY/INT0/OC3B/OC4B)

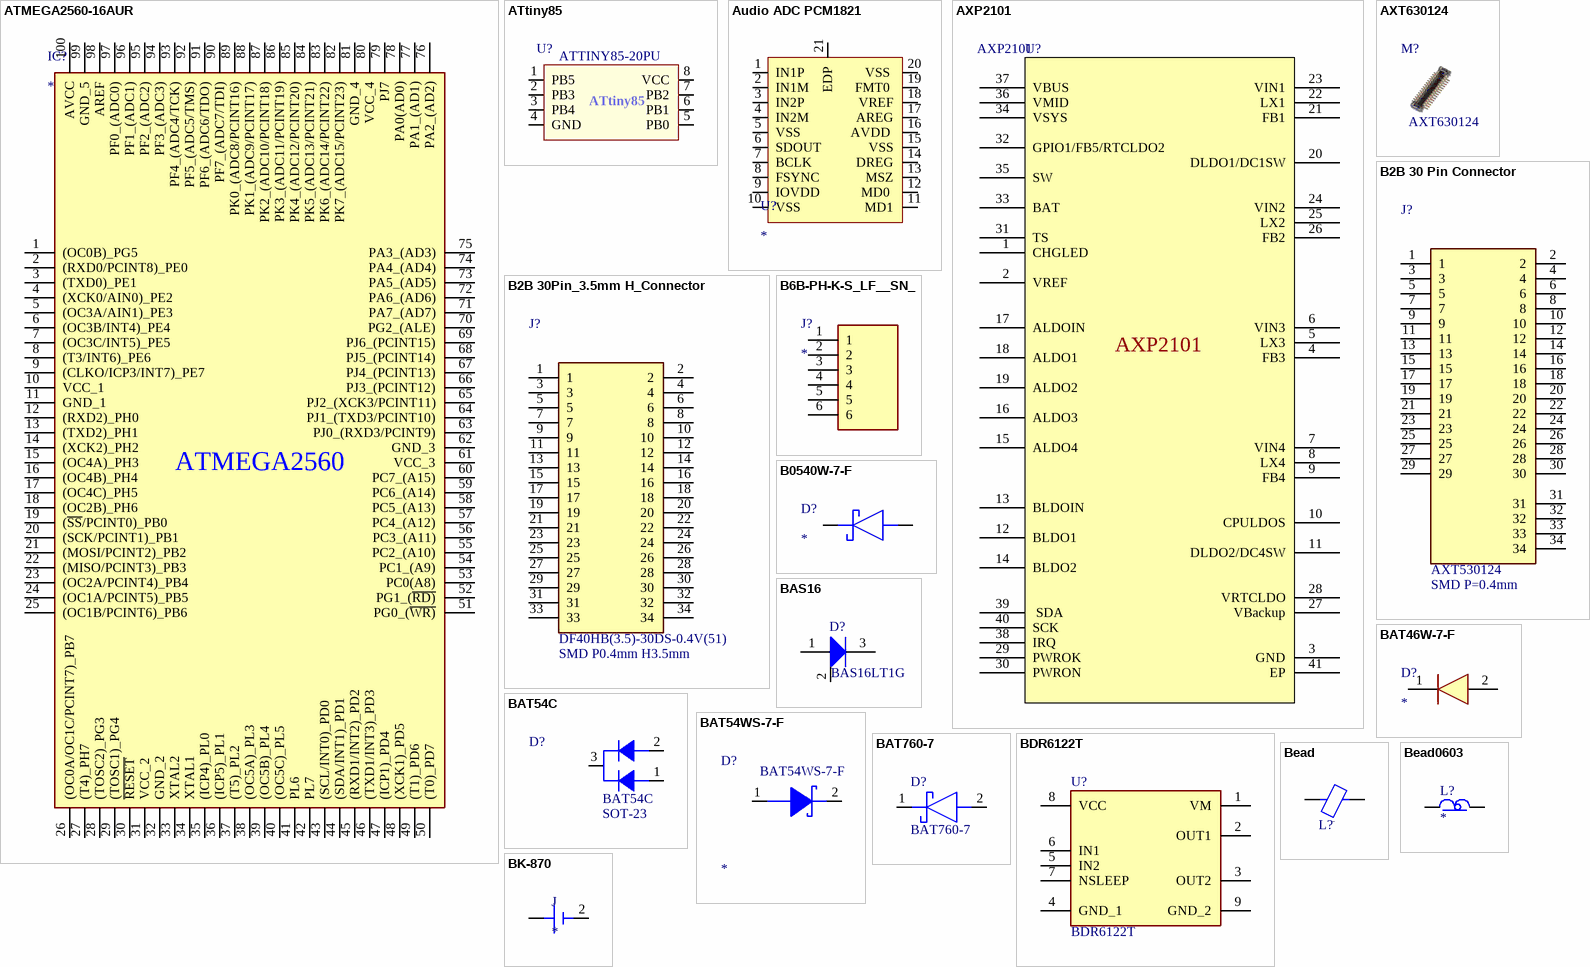
[diagram p6: symbols ATMEGA2560-16AUR to BK-870]

## ATMEGA2560-16AUR
designator IC?
Integrated Circuit
footprint TQFP-100
pins: 1 (OC0B)_PG5, 2 (RXD0/PCINT8)_PE0, 3 (TXD0)_PE1, 4 (XCK0/AIN0)_PE2, 5 (OC3A/AIN1)_PE3, 6 (OC3B/INT4)_PE4, 7 (OC3C/INT5)_PE5, 8 (T3/INT6)_PE6, 9 (CLKO/ICP3/INT7)_PE7, 10 VCC_1, 11 GND_1, 12 (RXD2)_PH0, 13 (TXD2)_PH1, 14 (XCK2)_PH2, 15 (OC4A)_PH3, 16 (OC4B)_PH4, 17 (OC4C)_PH5, 18 (OC2B)_PH6, 19 (~{SS}/PCINT0)_PB0, 20 (SCK/PCINT1)_PB1, 21 (MOSI/PCINT2)_PB2, 22 (MISO/PCINT3)_PB3, 23 (OC2A/PCINT4)_PB4, 24 (OC1A/PCINT5)_PB5, 25 (OC1B/PCINT6)_PB6, 26 (OC0A/OC1C/PCINT7)_PB7, 27 (T4)_PH7, 28 (TOSC2)_PG3, 29 (TOSC1)_PG4, 30 ~{RESET}, 31 VCC_2, 32 GND_2, 33 XTAL2, 34 XTAL1, 35 (ICP4)_PL0, 36 (ICP5)_PL1, 37 (T5)_PL2, 38 (OC5A)_PL3, 39 (OC5B)_PL4, 40 (OC5C)_PL5, 41 PL6, 42 PL7, 43 (SCL/INT0)_PD0, 44 (SDA/INT1)_PD1, 45 (RXD1/INT2)_PD2, 46 (TXD1/INT3)_PD3, 47 (ICP1)_PD4, 48 (XCK1)_PD5, 49 (T1)_PD6, 50 (T0)_PD7, 51 PG0_(~{WR)}, 52 PG1_(~{RD)}, 53 PC0(A8), 54 PC1_(A9), 55 PC2_(A10), 56 PC3_(A11), 57 PC4_(A12), 58 PC5_(A13), 59 PC6_(A14), 60 PC7_(A15), 61 VCC_3, 62 GND_3, 63 PJ0_(RXD3/PCINT9), 64 PJ1_(TXD3/PCINT10), 65 PJ2_(XCK3/PCINT11), 66 PJ3_(PCINT12), 67 PJ4_(PCINT13), 68 PJ5_(PCINT14), 69 PJ6_(PCINT15), 70 PG2_(ALE), 71 PA7_(AD7), 72 PA6_(AD6), 73 PA5_(AD5), 74 PA4_(AD4), 75 PA3_(AD3), 76 PA2_(AD2), 77 PA1_(AD1), 78 PA0(AD0), 79 PJ7, 80 VCC_4, 81 GND_4, 82 PK7_(ADC15/PCINT23), 83 PK6_(ADC14/PCINT22), 84 PK5_(ADC13/PCINT21), 85 PK4_(ADC12/PCINT20), 86 PK3_(ADC11/PCINT19), 87 PK2_(ADC10/PCINT18), 88 PK1_(ADC9/PCINT17), 89 PK0_(ADC8/PCINT16), 90 PF7_(ADC7/TDI), 91 PF6_(ADC6/TDO), 92 PF5_(ADC5/TMS), 93 PF4_(ADC4/TCK), 94 PF3_(ADC3), 95 PF2_(ADC2), 96 PF1_(ADC1), 97 PF0_(ADC0), 98 AREF, 99 GND_5, 100 AVCC
text: ATMEGA2560

## ATtiny85
designator U?  Manufacturer Part Number: ATTINY85-20PU
MCU 8-bit ATtiny AVR RISC 8KB Flash 3.3V/5V 8-Pin PDIP W; Manufacturer 1: Microchip / Atmel; Number of I/Os: 6; Frequency: 20MHz; Oscillator Type: Internal; Peripherals: Brown-out Detect/Reset,POR,PWM,WDT; Data Bus Width: 8b; Min Supply Voltage: 2.7V; Max Supply Voltage: 5.5V; RAM Size: 512B; Number of Timers/Counters: 2; Interface: SPI; Watchdog Timer: Yes; Number of ADC Channels: 4; Number of SPI Channels: 1; Access Time: 20us; Supplier 1: Digi-Key; RoHS: Yes; Category: Microcontrollers; Stock 1: 6190; Pricing 1: 1=1.20000, 25=1.10000, 100=1.00000 (USD); Mount: Through Hole; Case/Package: DIP-8; Number of Pins: 8; Contact Plating: Tin,Matte; Min Operating Temperature: -40°C; Max Operating Temperature: 85°C; Packaging: Rail/Tube; Memory Type: FLASH; Memory Size: 8KB; Core Architecture: AVR; Package Quantity: 50; Max Frequency: 20MHz; Number of Programmable I/O: 6; Number of PWM Channels: 6; Number of I2C Channels: 1; Number of UART Channels: 1; Termination: Through Hole; Length: 10.16mm; Height: 0.195inch; Width: 0.28inch; Radiation Hardening: No; Lead Free: Lead Free; REACH SVHC: No SVHC; ComponentLink1URL: https://datasheet.ciiva.com/28653/1693899-28653824.pdf?src-supplier=Element14; ComponentLink1Description: https://datasheet.ciiva.com/28653/1693899-28653824.pdf?src-supplier=Element14; ComponentLink2URL: https://datasheet.ciiva.com/20168/73-5122-20168321.pdf?src-supplier=Rapid+Electronics; ComponentLink2Description: https://datasheet.ciiva.com/20168/73-5122-20168321.pdf?src-supplier=Rapid+Electronics; ComponentLink3URL: https://datasheet.ciiva.com/19457/2151312-19457156.pdf?src-supplier=Jameco; ComponentLink3Description: https://datasheet.ciiva.com/19457/2151312-19457156.pdf?src-supplier=Jameco; ComponentLink4URL: https://datasheet.ciiva.com/15213/getdatasheetpartid-226075-15213319.pdf?src-supplier=Verical; ComponentLink4Description: https://datasheet.ciiva.com/15213/getdatasheetpartid-226075-15213319.pdf?src-supplier=Verical; ComponentLink5URL: https://datasheet.ciiva.com/3203/doc2586-3203149.pdf?src-supplier=Avnet; ComponentLink5Description: https://datasheet.ciiva.com/3203/doc2586-3203149.pdf?src-supplier=Avnet; Supplier Part Number 1: ATTINY85-20PU-ND
footprint DIP-8 (DIP; 8 Leads; Row Spacing 7.62 mm; Pitch 2.54 mm)
pins: 1 PB5, 2 PB3, 3 PB4, 4 GND, 5 PB0, 6 PB1, 7 PB2, 8 VCC

## Audio ADC PCM1821
designator U?
Manufacturer Part Number: PCM1821IRTER; Case/Package: *; ComponentLink1Description: New link; ComponentLink1URL: https://www.mouser.in/ProductDetail/Texas-Instruments/PCM1821IRTER?qs=QNEnbhJQKvZHFR9I0sKPCw%3D%3D
pins: 1 IN1P, 2 IN1M , 3 IN2P , 4 IN2M, 5 VSS , 6 SDOUT , 7 BCLK, 8 FSYNC , 9 IOVDD, 10 VSS , 11 MD1, 12 MD0 , 13 MSZ, 14 DREG, 15 VSS, 16 AVDD , 17 AREG, 18 VREF, 19 FMT0 , 20 VSS , 21 EDP

## AXP2101
designator U?  Case/Package: QFN40
PMIC; Manufacturer Part Number: AX2101
pins: 1 CHGLED, 2 VREF, 3 GND, 4 FB3, 5 LX3, 6 VIN3, 7 VIN4, 8 LX4, 9 FB4, 10 CPULDOS, 11 DLDO2/DC4SW, 12 BLDO1, 13 BLDOIN, 14 BLDO2, 15 ALDO4, 16 ALDO3, 17 ΑLDOIN, 18 ALDO1, 19 ALDO2, 20 DLDO1/DC1SW, 21 FB1, 22 LX1, 23 VIN1, 24 VIN2, 25 LX2, 26 FB2, 27 VBackup, 28 VRTCLDO, 29 PWROK, 30 PWRON, 31 TS, 32 GPIO1/FB5/RTCLDO2, 33 BAT, 34 VSYS, 35 SW, 36 VMID, 37 VBUS, 38 IRQ, 39  SDA, 40 SCK, 41 EP

## AXT630124
designator M?  Manufacturer Part Number: AXT630124  (hidden comment: *)  (mechanical)
Mating conn of AXT530124

## B2B 30 Pin Connector
designator J?  Manufacturer Part Number: AXT530124  Case/Package: SMD P=0.4mm
board to board connector AXT530124 pins 0.4mm pitch
footprint AXT530124 (B2B_3.p_.4Pitch)
pins: 1, 2, 3, 4, 5, 6, 7, 8, 9, 10, 11, 12, 13, 14, 15, 16, 17, 18, 19, 20, 21, 22, 23, 24, 25, 26, 27, 28, 29, 30, 31, 32, 33, 34

## B2B 30Pin_3.5mm H_Connector
designator J?  Manufacturer Part Number: DF40HB(3.5)-30DS-0.4V(51)  Case/Package: SMD P0.4mm H3.5mm
30 Position Connector Receptacle, Center Strip Contacts Surface Mount Gold
footprint DF40HB(3.5)-30DS-0.4V(51) (B2B_3.5H_30P_.4Pitch)
pins: 1, 2, 3, 4, 5, 6, 7, 8, 9, 10, 11, 12, 13, 14, 15, 16, 17, 18, 19, 20, 21, 22, 23, 24, 25, 26, 27, 28, 29, 30, 31, 32, 33, 34

## B6B-PH-K-S_LF__SN_
designator J?
Connector; Manufacturer_Name: JST (JAPAN SOLDERLESS TERMINALS); Manufacturer Part Number: B6B-PH-K-S(LF)(SN); Datasheet Link: http://docs-emea.rs-online.com/webdocs/1347/0900766b81347511.pdf; Height: 6mm
footprint SHDR6W50P0X200_1X6_1390X450X600P
pins: 1, 2, 3, 4, 5, 6

## B0540W-7-F
designator D?
B0540W-7-F - Schottky Rectifier; Manufacturer Name: Diodes Inc.; Case/Parameter: SOD3716; Value: *; Manufacturer Part Number: B0540W-7-F
footprint SOD3716X145N
pins: 1 K, 2 A

## BAS16
designator D?  Manufacturer Part Number: BAS16LT1G
Manufacturer: ON Semiconductor; Forward Current: 200mA; Peak Reverse Current: 1uA; Max Surge Current: 500mA; Recovery Time: 6ns; Forward Voltage: 1.25V; Max Repetitive Reverse Voltage (Vrrm): 75V; Power Dissipation: 300mW; Element Configuration: Single; Polarity: Standard; Capacitance: 2pF; ComponentLink1Description: Manufacturer Link; ComponentLink1URL: http://www.fairchildsemi.com/; ComponentLink2Description: Datasheet; ComponentLink2URL: http://www.fairchildsemi.com/ds/1N%2F1N4001.pdf; Supplier 1: Digi-Key; Stock 1: 1889118; Pricing 1: 1=0.11, 10=0.1, 100=0.0545, 500=0.0335, 1000=0.0229 (USD); Case/Package: SOT-23-3; Number of Pins: 3; Contact Plating: Tin,Matte; Min Operating Temperature: -55°C; Max Operating Temperature: 150°C; Package Quantity: 1; Packaging: Tape and Reel; Max Reverse Leakage Current: 1uA; Average Rectified Current: 200mA; Reverse Recovery Time: 6ns; Max Reverse Voltage (DC): 75V; Peak Non-Repetitive Surge Current: 500mA; Max Forward Surge Current (Ifsm): 500mA; Voltage Rating (DC): 75V; Current Rating: 200mA; Output Current: 200mA; Length: 0.119inch; Height: 0.04inch; Width: 0.055inch; Radiation Hardening: No; Lead Free: Lead Free; Halogen Free: Halogen Free; REACH SVHC: No SVHC; ComponentLink3URL: http://www.mouser.com/ds/2/308/BAS16LT1-D-103448.pdf?src-supplier=Mouser; ComponentLink3Description: http://www.mouser.com/ds/2/308/BAS16LT1-D-103448.pdf?src-supplier=Mouser; ComponentLink4URL: http://www.onsemi.com/pub/Collateral/BAS16LT1-D.PDF?src-supplier=Digi-Key; ComponentLink4Description: http://www.onsemi.com/pub/Collateral/BAS16LT1-D.PDF?src-supplier=Digi-Key; ComponentLink5URL: http://www.farnell.com/datasheets/1910407.pdf?src-supplier=Element14; ComponentLink5Description: http://www.farnell.com/datasheets/1910407.pdf?src-supplier=Element14; ComponentLink6URL: http://www.onsemi.com/pub/Collateral/BAS16LT1-D.PDF?src-supplier=Avnet; ComponentLink6Description: http://www.onsemi.com/pub/Collateral/BAS16LT1-D.PDF?src-supplier=Avnet; ComponentLink7URL: http://www.onsemi.com/pub/Collateral/BAS16LT1-D.PDF?src-supplier=Future+Electronics; ComponentLink7Description: http://www.onsemi.com/pub/Collateral/BAS16LT1-D.PDF?src-supplier=Future+Electronics; ComponentLink8URL: http://www.farnell.com/datasheets/1708231.pdf?src-supplier=Element14; ComponentLink8Description: http://www.farnell.com/datasheets/1708231.pdf?src-supplier=Element14; ComponentLink9URL: http://www.onsemi.com/pub/Collateral/BAS16LT1-D.PDF?src-supplier=Avnet+Europe; ComponentLink9Description: http://www.onsemi.com/pub/Collateral/BAS16LT1-D.PDF?src-supplier=Avnet+Europe; Supplier Part Number 1: BAS16LT1GOSCT-ND
simulation model 1N4001 (DIODE)
signal-integrity model 1N4001
footprint SOT23_MMB3904
pins: 1, 2, 3

## BAT46W-7-F
designator D?
Diodes Inc BAT46W-7-F; Manufacturer Part Number: BAT46W-7-F; Case/Package: SOD-123
footprint SOD3716X145N
pins: 1 K, 2 A

## BAT54C
designator D?  Manufacturer Part Number: BAT54C  Case/Package: SOT-23
Dual Schottky barrier£¬BAT54C SOT-23 Schottky Barrier
footprint SOT23 (SOT-23; 3 Leads; Body 3.0 x 2.6 mm Pitch 0.95mm)
pins: 1 A1, 2 A2, 3 K